# Altium schematic symbol library BARKO_SCHLIB.SchLib: 1064 symbols (part 9 of 11) (continued)
## R-5K6-0805 (continued)
RES SMD 5.6K OHM 1% 1/8W 0805; Manufacturer: Samsung; Manufacturer Part Number: RC2012F562CS; Resistance: 5.6kR; Power Rating: 125mW; Temperature Coefficient: 100ppm/°C; Voltage Rating (DC): 150V; .PCBCHK: USED; .Creator: F:TALI; Washability: OK; Stock 1: 13242; Pricing 1: 1=0.1, 10=0.059, 100=0.024, 1000=0.01079, 2500=0.00936 (USD); Case/Package: 0805; Case Code (Metric): 2012; Contact Plating: Tin; Min Operating Temperature: -55°C; Max Operating Temperature: 155°C; Tolerance: 1%; Packaging: Tape and Reel; Composition: Thick Film; Package Quantity: 1; Number of Terminations: 2; Max Power Dissipation: 125mW; Features: Moisture Resistant; Length: 0.079inch; Height: 0.024inch; Width: 0.049inch; Radiation Hardening: No; Lead Free: Lead Free; ComponentLink1URL: http://www1.futureelectronics.com/doc/SAMSUNG/RC2012F1004CS.pdf; ComponentLink1Description: http://www1.futureelectronics.com/doc/SAMSUNG/RC2012F1004CS.pdf; Stock 2: 21475; Pricing 2: 1=0.1, 10=0.069, 100=0.028, 1000=0.01256, 2500=0.0109 (USD); Mount: Surface Mount; Number of Pins: 2; Weight: 0.000194oz; Voltage Rating: 150V; Military Standard: Not; Termination: SMD/SMT; Depth: 1.25mm; REACH SVHC: Unknown; ComponentLink2URL: http://www.farnell.com/datasheets/2111203.pdf; ComponentLink2Description: http://www.farnell.com/datasheets/2111203.pdf; ComponentLink3URL: http://uk.rs-online.com/webdocs/0d98/0900766b80d98b26.pdf; ComponentLink3Description: http://uk.rs-online.com/webdocs/0d98/0900766b80d98b26.pdf; ComponentLink4URL: https://www.alliedelec.com/m/d/0c934d6939ccefa68dbe0b96d821c8cf.pdf; ComponentLink4Description: https://www.alliedelec.com/m/d/0c934d6939ccefa68dbe0b96d821c8cf.pdf; ComponentLink5URL: http://www.vishay.com/docs/20035/dcrcwe3.pdf; ComponentLink5Description: http://www.vishay.com/docs/20035/dcrcwe3.pdf; ComponentLink6URL: http://www.farnell.com/datasheets/2046716.pdf; ComponentLink6Description: http://www.farnell.com/datasheets/2046716.pdf; ComponentLink7URL: https://www.distrelec.biz/Web/Downloads/a_/en/flD-CRCW-e3_data_en.pdf?mime=application%2Fpdf; ComponentLink7Description: https://www.distrelec.biz/Web/Downloads/a_/en/flD-CRCW-e3_data_en.pdf?mime=application%2Fpdf; ComponentLink8URL: http://www.farnell.com/datasheets/1847332.pdf; ComponentLink8Description: http://www.farnell.com/datasheets/1847332.pdf; Stock 3: 198503; Pricing 3: 1=0.1, 10=0.081, 100=0.0311, 1000=0.01367, 2500=0.01181 (USD); ComponentLink9URL: http://industrial.panasonic.com/www-data/pdf/AOA0000/AOA0000CE2.pdf; ComponentLink9Description: http://industrial.panasonic.com/www-data/pdf/AOA0000/AOA0000CE2.pdf; ComponentLink10URL: http://www.farnell.com/datasheets/426256.pdf; ComponentLink10Description: http://www.farnell.com/datasheets/426256.pdf; ComponentLink11URL: http://www.farnell.com/datasheets/1678782.pdf; ComponentLink11Description: http://www.farnell.com/datasheets/1678782.pdf; ComponentLink12URL: https://www.alliedelec.com/m/d/623f45ff1957d936ff56d46fd1c28cac.pdf; ComponentLink12Description: https://www.alliedelec.com/m/d/623f45ff1957d936ff56d46fd1c28cac.pdf; ComponentLink13URL: http://www.mouser.com/ds/2/315/AOA0000C283-1093288.pdf; ComponentLink13Description: http://www.mouser.com/ds/2/315/AOA0000C283-1093288.pdf; .SCHCHK: USED; Supplier 1: Digi-Key; Supplier Part Number 1: 1276-5314-1-ND
footprint R-0805
pins: 1, 2

## R-5mR-1206
designator R?, comment 5mR  Power Rating: 3/4W  Case/Package: 1206
RES 0.005 OHM 2% 3/4W 1206; Manufacturer: Susumu; Manufacturer Part Number: KRL1632E-M-R005-G-T5; Temperature Coefficient: 100ppm/°C; Max Power Dissipation: 750mW; Washability: OK; .Creator: M.OZKAN; .PCBCHK: USED; Supplier 1: Digi-Key; Stock 1: 6696; Pricing 1: 1 = 0.54000, 10 = 0.38500, 25 = 0.30040, 50 = 0.25420, 100 = 0.20020, 250 = 0.16940, 500 = 0.13860, 1000 = 0.10780 (USD); RoHS: Yes; Case Code (Metric): 1632; Case Code (Imperial): 0612; Min Operating Temperature: -55°C; Max Operating Temperature: 155°C; Resistance: 5mR; Tolerance: 2%; Packaging: Tape and Reel; Package Quantity: 5000; Termination: SMD/SMT; Composition: Metal Foil; Number of Terminations: 2; Features: Automotive AEC-Q200; Length: 0.126inch; Height: 0.028inch; Width: 1.6mm; ComponentLink1URL: https://datasheet.ciiva.com/14981/krl-new-short-data-sheet-14981981.pdf?src-supplier=Digi-Key; ComponentLink1Description: https://datasheet.ciiva.com/14981/krl-new-short-data-sheet-14981981.pdf?src-supplier=Digi-Key; ComponentLink2URL: https://datasheet.ciiva.com/14981/krl-new-short-data-sheet-14981982.pdf?src-supplier=Digi-Key; ComponentLink2Description: https://datasheet.ciiva.com/14981/krl-new-short-data-sheet-14981982.pdf?src-supplier=Digi-Key; Supplier Part Number 1: 408-1565-1-ND; .SCHCHK: USED
footprint R-1206
pins: 1, 2

## R-6k2-1206-0.1%
designator R?, comment 6K2  Tolerance: 0.1%  Case/Package: 1206
RES SMD 6.2K OHM 0.1% 1/4W 1206; Manufacturer: Panasonic; Manufacturer Part Number: ERA-8AEB622V; Resistance: 6.2kR; Temperature Coefficient: 25ppm/°C; Power Rating: 250mW; Voltage Rating: 150V; Supplier 1: Digi-Key; Supplier Part Number 1: P6.2KBCCT-ND; Stock: 6467; Pricing: 1=0.57, 10=0.411, 100=0.2135, 1000=0.1149, 2500=0.1117 (USD); RoHS: Yes; Mount: Surface Mount; Number of Pins: 2; Contact Plating: Tin; Case Code (Metric): 3216; Case Code (Imperial): 1206; Min Operating Temperature: -55°C; Max Operating Temperature: 155°C; Resistor Type: Thin Film,Metal Film; Packaging: Tape and Reel; Package Quantity: 5000; Number of Terminations: 2; Termination: SMD/SMT; Max Power Dissipation: 250mW; Voltage Rating (DC): 150V; Length: 3.2mm; Width: 0.063inch; Height: 0.6mm; Depth: 1.6mm; Radiation Hardening: No; REACH SVHC: No SVHC; Military Standard: Not; Lead Free: Lead Free; ComponentLink1URL: https://datasheet.ciiva.com/48425/era-eng-tds-48425576.pdf?src-supplier=Distrelec; ComponentLink1Description: https://datasheet.ciiva.com/48425/era-eng-tds-48425576.pdf?src-supplier=Distrelec; ComponentLink2URL: https://datasheet.ciiva.com/17212/aoa0000ce26-17212732.pdf?src-supplier=Avnet+Europe; ComponentLink2Description: https://datasheet.ciiva.com/17212/aoa0000ce26-17212732.pdf?src-supplier=Avnet+Europe; ComponentLink3URL: https://datasheet.ciiva.com/48529/era-eng-tds-48529628.pdf?src-supplier=Distrelec; ComponentLink3Description: https://datasheet.ciiva.com/48529/era-eng-tds-48529628.pdf?src-supplier=Distrelec; ComponentLink4URL: https://datasheet.ciiva.com/5875/391390-5875614.pdf?src-supplier=Farnell; ComponentLink4Description: https://datasheet.ciiva.com/5875/391390-5875614.pdf?src-supplier=Farnell
footprint R-1206
pins: 1, 2

## R-6K04-0402
designator R?, comment 6K04  Case Code (Imperial): 0402
RES SMD 6.04K OHM 1% 1/10W 0402; Manufacturer: Panasonic; Manufacturer Part Number: ERJ-2RKF6041X; Resistance: 6.04kR; Power Rating: 100mW; Voltage Rating: 50V; Temperature Coefficient: 100ppm/°C; .PCBCHK: USED; .Creator: F:TALI; Washability: OK; Stock 1: 815195; Pricing 1: 1=0.1, 10=0.045, 100=0.0183, 1000=0.00823, 2500=0.00715, 5000=0.0059 (USD); Mount: Surface Mount; Case/Package: 0402; Case Code (Metric): 1005; Contact Plating: Tin; Min Operating Temperature: -55°C; Max Operating Temperature: 155°C; Tolerance: 1%; Packaging: Tape and Reel; Package Quantity: 1; Composition: Thick Film; Number of Terminations: 2; Termination: SMD/SMT; Military Standard: Not; Max Power Dissipation: 100mW; Voltage Rating (DC): 50V; Features: Automotive AEC-Q200; Length: 1mm; Height: 0.35mm; Width: 0.02inch; Depth: 0.5mm; REACH SVHC: Unknown; Lead Free: Lead Free; ComponentLink1URL: http://www.farnell.com/datasheets/1911175.pdf; ComponentLink1Description: http://www.farnell.com/datasheets/1911175.pdf; ComponentLink2URL: http://www.farnell.com/datasheets/1678782.pdf; ComponentLink2Description: http://www.farnell.com/datasheets/1678782.pdf; ComponentLink3URL: http://www.jameco.com/Jameco/Products/ProdDS/1987409.pdf; ComponentLink3Description: http://www.jameco.com/Jameco/Products/ProdDS/1987409.pdf; ComponentLink4URL: http://www.mouser.com/ds/2/315/AOA0000CE2-37512.pdf; ComponentLink4Description: http://www.mouser.com/ds/2/315/AOA0000CE2-37512.pdf; ComponentLink5URL: http://industrial.panasonic.com/www-data/pdf/AOA0000/AOA0000CE2.pdf; ComponentLink5Description: http://industrial.panasonic.com/www-data/pdf/AOA0000/AOA0000CE2.pdf; ComponentLink6URL: https://www.alliedelec.com/m/d/623f45ff1957d936ff56d46fd1c28cac.pdf; ComponentLink6Description: https://www.alliedelec.com/m/d/623f45ff1957d936ff56d46fd1c28cac.pdf; ComponentLink7URL: http://www.farnell.com/datasheets/426256.pdf; ComponentLink7Description: http://www.farnell.com/datasheets/426256.pdf; Stock 2: 46790; Pricing 2: 1=0.1, 10=0.016, 100=0.0064, 1000=0.00289, 2500=0.0025, 5000=0.00207 (USD); Radiation Hardening: No; Stock 3: 150070; Pricing 3: 1=0.1, 10=0.021, 100=0.0087, 1000=0.00391, 2500=0.00339, 5000=0.0028 (USD); ComponentLink8URL: http://www.samsungsem.com/kr/support/product-search/chip-resistor/RC1005F6041CS.jsp; ComponentLink8Description: http://www.samsungsem.com/kr/support/product-search/chip-resistor/RC1005F6041CS.jsp; ComponentLink9URL: http://www.samsungsem.com/kr/support/library/product-catalog/__icsFiles/afieldfile/2015/09/22/CHIP_RESISTOR_2015.pdf; ComponentLink9Description: http://www.samsungsem.com/kr/support/library/product-catalog/__icsFiles/afieldfile/2015/09/22/CHIP_RESISTOR_2015.pdf; ComponentLink10URL: https://produktinfo.conrad.com/datenblaetter/625000-649999/631535-da-01-en-SMD_WID_RC_1005_6K04_1__0_063W_10000ST.pdf; ComponentLink10Description: https://produktinfo.conrad.com/datenblaetter/625000-649999/631535-da-01-en-SMD_WID_RC_1005_6K04_1__0_063W_10000ST.pdf; .SCHCHK: USED; Supplier 1: Digi-Key; Supplier Part Number 1: RMCF0402FT6K04CT-ND
footprint R-0402
pins: 1, 2

## R-6K04-0603
designator R?, comment 6K04  Case/Package: 0603
RES 6.04K OHM 1% 1/10W 0603; Manufacturer: Stackpole Electronics; Manufacturer Part Number: RMCF0603FT6K04; Resistance: 6.04kR; Power Rating: 100mW; Temperature Coefficient: 100ppm/°C; Washability: OK; .Creator: M.OZKAN; .PCBCHK: USED; Supplier 1: Digi-Key; Stock 1: 117757; Pricing 1: 1=0.10000, 10=0.01700, 100=0.00680, 1000=0.00306, 2500=0.00266 (USD); RoHS: Yes; Mount: Surface Mount; Case Code (Metric): 1608; Case Code (Imperial): 0603; Contact Plating: Tin; Min Operating Temperature: -55°C; Max Operating Temperature: 155°C; Packaging: Tape and Reel; Tolerance: 1%; Composition: Thick Film; Number of Terminations: 2; Max Power Dissipation: 100mW; Features: Automotive AEC-Q200; Length: 0.061inch; Height: 0.022inch; Width: 0.031inch; Radiation Hardening: No; Lead Free: Lead Free; ComponentLink1URL: https://www.seielect.com/catalog/SEI-RMCF_RMCP.pdf?src-supplier=Avnet; ComponentLink1Description: https://www.seielect.com/catalog/SEI-RMCF_RMCP.pdf?src-supplier=Avnet; ComponentLink2URL: https://www.seielect.com/catalog/SEI-Packaging.pdf?src-supplier=Digi-Key; ComponentLink2Description: https://www.seielect.com/catalog/SEI-Packaging.pdf?src-supplier=Digi-Key; ComponentLink3URL: http://www.seielect.com/Catalog/SEI-RMC.pdf?src-supplier=Future+Electronics; ComponentLink3Description: http://www.seielect.com/Catalog/SEI-RMC.pdf?src-supplier=Future+Electronics; ComponentLink4URL: http://components.arrow.com/part/dataview/44987894S7815445N1174?src-supplier=Arrow; ComponentLink4Description: http://components.arrow.com/part/dataview/44987894S7815445N1174?src-supplier=Arrow; ComponentLink5URL: https://www.seielect.com/catalog/SEI-RMCF_RMCP.pdf?src-supplier=Avnet+Asia; ComponentLink5Description: https://www.seielect.com/catalog/SEI-RMCF_RMCP.pdf?src-supplier=Avnet+Asia; Supplier Part Number 1: RMCF0603FT6K04CT-ND; .SCHCHK: USED
footprint R-0603
pins: 1, 2

## R-6K8-0603
designator R?, comment 6K8  Case Code (Imperial): 0603
RES SMD 6.8K OHM 5% 1/10W 0603; Manufacturer: Yageo; Manufacturer Part Number: RC0603JR-076K8L; Resistance: 6.8kR; Power Rating: 100mW; Voltage Rating: 50V; Temperature Coefficient: 100ppm/°C; Working Voltage: 75V; .PCBCHK: USED; .Creator: F:TALI; Washability: OK; Supplier 1: Digi-Key; Supplier Part Number 1: 311-6.8KGRDKR-ND; Stock 1: 0; Pricing 1: 1=0.1, 10=0.022, 100=0.0088, 1000=0.00396, 2500=0.00344 (USD); Case/Package: 0603; Number of Pins: 2; Case Code (Metric): 1608; Min Operating Temperature: -55°C; Max Operating Temperature: 155°C; Tolerance: 5%; Voltage Rating (DC): 50V; Packaging: Tape and Reel; Termination: SMD/SMT; Composition: Thick Film; Military Standard: Not; Number of Terminations: 2; Length: 1.6mm; Height: 0.45mm; Width: 0.8mm; Depth: 0.8mm; REACH SVHC: No SVHC; Lead Free: Lead Free; ComponentLink1URL: http://www.farnell.com/datasheets/1868787.pdf; ComponentLink1Description: http://www.farnell.com/datasheets/1868787.pdf; ComponentLink2URL: http://www.farnell.com/datasheets/443971.pdf; ComponentLink2Description: http://www.farnell.com/datasheets/443971.pdf; ComponentLink3URL: http://www.mouser.com/catalog/specsheets/RC0603.pdf; ComponentLink3Description: http://www.mouser.com/catalog/specsheets/RC0603.pdf; Supplier 2: Digi-Key; Supplier Part Number 2: SR0603JR-076K8L-ND; Stock 2: 0; Pricing 2: 5000=0.02189 (USD); Max Power Dissipation: 100mW; Features: Automotive AEC-Q200; Mount: Surface Mount; Weight: 7.1E-05oz; Contact Plating: Tin; Package Quantity: 1; Radiation Hardening: No; ComponentLink4URL: http://www.vishay.com/docs/20035/dcrcwe3.pdf; ComponentLink4Description: http://www.vishay.com/docs/20035/dcrcwe3.pdf; ComponentLink5URL: http://www.mouser.com/ds/2/427/dcrcwe3-109170.pdf; ComponentLink5Description: http://www.mouser.com/ds/2/427/dcrcwe3-109170.pdf; ComponentLink6URL: https://www.alliedelec.com/m/d/0c934d6939ccefa68dbe0b96d821c8cf.pdf; ComponentLink6Description: https://www.alliedelec.com/m/d/0c934d6939ccefa68dbe0b96d821c8cf.pdf; ComponentLink7URL: http://www.farnell.com/datasheets/1807946.pdf; ComponentLink7Description: http://www.farnell.com/datasheets/1807946.pdf; Supplier 3: Digi-Key; Supplier Part Number 3: P6.80KHCT-ND; Stock 3: 521469; Pricing 3: 1=0.1, 10=0.065, 100=0.0264, 1000=0.01186, 2500=0.01029 (USD); ComponentLink8URL: http://industrial.panasonic.com/www-data/pdf/AOA0000/AOA0000CE2.pdf; ComponentLink8Description: http://industrial.panasonic.com/www-data/pdf/AOA0000/AOA0000CE2.pdf; ComponentLink9URL: http://www.farnell.com/datasheets/1678782.pdf; ComponentLink9Description: http://www.farnell.com/datasheets/1678782.pdf; ComponentLink10URL: https://www.alliedelec.com/m/d/623f45ff1957d936ff56d46fd1c28cac.pdf; ComponentLink10Description: https://www.alliedelec.com/m/d/623f45ff1957d936ff56d46fd1c28cac.pdf; ComponentLink11URL: http://www.mouser.com/ds/2/315/AOA0000C283-1093288.pdf; ComponentLink11Description: http://www.mouser.com/ds/2/315/AOA0000C283-1093288.pdf; ComponentLink12URL: http://www.farnell.com/datasheets/426256.pdf; ComponentLink12Description: http://www.farnell.com/datasheets/426256.pdf; .SCHCHK: USED
footprint R-0603
pins: 1, 2

## R-6K8-0805
designator R?, comment 6K8  Case Code (Imperial): 0805
RES SMD 6.8K OHM 1% 1/8W 0805; Manufacturer: Yageo; Manufacturer Part Number: RC0805FR-076K8L; Resistance: 6.8kR; Power Rating: 125mW; Temperature Coefficient: 100ppm/°C; Voltage Rating: 150V; .PCBCHK: USED; .Creator: F:TALI; Washability: OK; Supplier 1: Digi-Key; Supplier Part Number 1: 311-6.80KCRCT-ND; Stock 1: 4564009; Pricing 1: 1=0.1, 10=0.046, 100=0.0186, 1000=0.00835, 2500=0.00725 (USD); Case/Package: 0805; Case Code (Metric): 2012; Min Operating Temperature: -55°C; Max Operating Temperature: 155°C; Tolerance: 1%; Packaging: Tape and Reel; Number of Terminations: 2; Package Quantity: 1; Termination: SMD/SMT; Composition: Thick Film; Max Power Dissipation: 125mW; Features: Moisture Resistant; Length: 0.079inch; Height: 0.024inch; Width: 0.049inch; Depth: 1.25mm; REACH SVHC: Unknown; Lead Free: Lead Free; ComponentLink1URL: http://www.yageo.com/documents/recent/PYu-RC_Group_51_RoHS_L_9.pdf; ComponentLink1Description: http://www.yageo.com/documents/recent/PYu-RC_Group_51_RoHS_L_9.pdf; ComponentLink2URL: http://documents.rs-components.com/techlib://itc_doclist_GB.htm?stockno=6181925; ComponentLink2Description: http://documents.rs-components.com/techlib://itc_doclist_GB.htm?stockno=6181925; ComponentLink3URL: http://www.yageo.com.tw/exep/pages/download/literatures/PYu-R_INT-thick_7.pdf; ComponentLink3Description: http://www.yageo.com.tw/exep/pages/download/literatures/PYu-R_INT-thick_7.pdf; ComponentLink4URL: http://www.farnell.com/datasheets/444164.pdf; ComponentLink4Description: http://www.farnell.com/datasheets/444164.pdf; Supplier 2: Digi-Key; Supplier Part Number 2: 311-6.8KARDKR-ND; Stock 2: 914; Pricing 2: 1=0.1, 10=0.039, 100=0.0159, 1000=0.00716, 2500=0.00622 (USD); Contact Plating: Lead,Matte,Tin; Military Standard: Not; Radiation Hardening: No; ComponentLink5URL: http://www.yageo.ru/pdf/RC0805.pdf; ComponentLink5Description: http://www.yageo.ru/pdf/RC0805.pdf; ComponentLink6URL: http://www.farnell.com/datasheets/442941.pdf; ComponentLink6Description: http://www.farnell.com/datasheets/442941.pdf; ComponentLink7URL: http://www.mouser.com/ds/2/447/Yageo_08112016_RC0805-968729.pdf; ComponentLink7Description: http://www.mouser.com/ds/2/447/Yageo_08112016_RC0805-968729.pdf; Supplier 3: Digi-Key; Supplier Part Number 3: YAG3748DKR-ND; Stock 3: 104504; Pricing 3: 1=0.1, 10=0.055, 100=0.0225, 1000=0.01009, 2500=0.00876 (USD); .SCHCHK: USED
footprint R-0805
pins: 1, 2

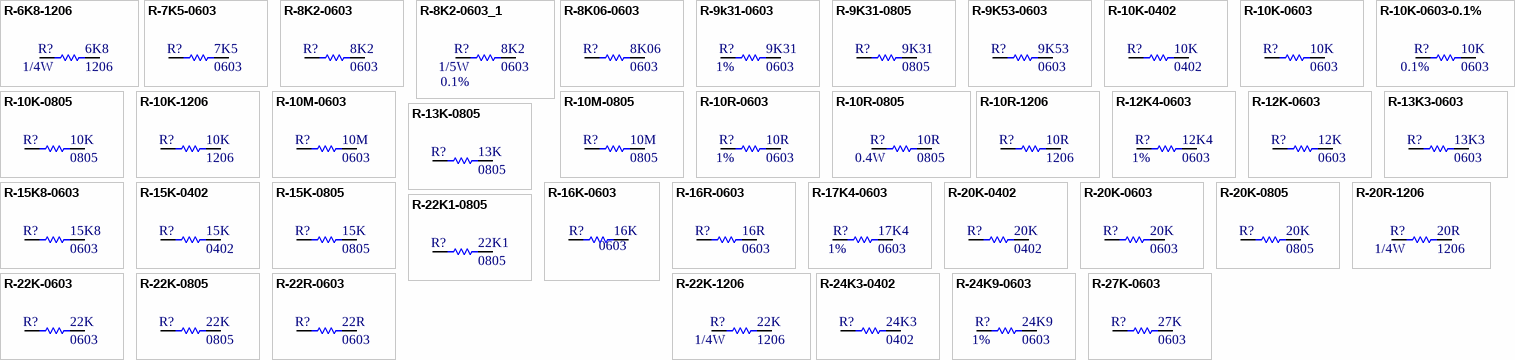
[diagram p37: symbols R-6K8-1206 to R-27K-0603]

## R-6K8-1206
designator R?, comment 6K8  Max Power Dissipation: 1/4W  Case Code (Imperial): 1206
RES SMD 6.8K 1/4W 5% 1206; Manufacturer: Panasonic; Manufacturer Part Number: ERJ-8ENF6801V; Resistance: 6.8kR; Tolerance: 1%; Temperature Coefficient: 100ppm/°C; Voltage Rating (DC): 200V; Power Rating: 250mW; .PCBCHK: USED; .Creator: F:TALI; Washability: OK; Stock 1: 0; Pricing 1: 1=0.11, 10=0.1, 100=0.0385, 1000=0.01695, 2500=0.01464 (USD); Mount: Surface Mount; Case/Package: 1206; Number of Pins: 2; Weight: 0.000571oz; Case Code (Metric): 3216; Contact Plating: Tin; Min Operating Temperature: -55°C; Max Operating Temperature: 155°C; Packaging: Tape and Reel; Composition: Thick Film; Number of Terminations: 2; Package Quantity: 1; Features: Automotive AEC-Q200; Military Standard: Not; Voltage Rating: 200V; Termination: SMD/SMT; Length: 3.2mm; Height: 0.6mm; Width: 1.6mm; Depth: 1.6mm; Radiation Hardening: No; REACH SVHC: No SVHC; ComponentLink1URL: http://www.farnell.com/datasheets/1678782.pdf; ComponentLink1Description: http://www.farnell.com/datasheets/1678782.pdf; ComponentLink2URL: http://industrial.panasonic.com/cdbs/www-data/pdf/RDA0000/AOA0000COL19.pdf; ComponentLink2Description: http://industrial.panasonic.com/cdbs/www-data/pdf/RDA0000/AOA0000COL19.pdf; ComponentLink3URL: http://www.farnell.com/datasheets/426256.pdf; ComponentLink3Description: http://www.farnell.com/datasheets/426256.pdf; ComponentLink4URL: https://www.alliedelec.com/m/d/623f45ff1957d936ff56d46fd1c28cac.pdf; ComponentLink4Description: https://www.alliedelec.com/m/d/623f45ff1957d936ff56d46fd1c28cac.pdf; ComponentLink5URL: http://industrial.panasonic.com/www-data/pdf/AOA0000/AOA0000CE2.pdf; ComponentLink5Description: http://industrial.panasonic.com/www-data/pdf/AOA0000/AOA0000CE2.pdf; Stock 2: 225848; Pricing 2: 1=0.1, 10=0.081, 100=0.0331, 1000=0.01487, 2500=0.01291 (USD); Lead Free: Lead Free; ComponentLink6URL: http://documents.rs-components.com/techlib://itc_doclist_GB.htm?stockno=6178626; ComponentLink6Description: http://documents.rs-components.com/techlib://itc_doclist_GB.htm?stockno=6178626; ComponentLink7URL: http://www.yageo.com/documents/recent/PYu-RC1206_51_RoHS_L-4.pdf; ComponentLink7Description: http://www.yageo.com/documents/recent/PYu-RC1206_51_RoHS_L-4.pdf; Stock 3: 13302; Pricing 3: 1=0.1, 10=0.03, 100=0.0121, 1000=0.00545, 2500=0.00473 (USD); .SCHCHK: USED; Supplier 1: Digi-Key; Supplier Part Number 1: RMCF1206JT6K80DKR-ND
footprint R-1206
pins: 1, 2

## R-7K5-0603
designator R?, comment 7K5  Case Code (Imperial): 0603
RES 7.5K OHM 1% 1/10W 0603; Manufacturer: Stackpole Electronics; Manufacturer Part Number: RMCF0603FT7K50; Washability: OK; .Creator: M.OZKAN; .PCBCHK: USED; Max Power Dissipation: 100mW; Temperature Coefficient: 100ppm/°C; Resistance: 7.5kR; ComponentLink1URL: https://datasheet.ciiva.com/26946/getdatasheetpartid-717664-26946710.pdf?src-supplier=Verical; ComponentLink1Description: https://datasheet.ciiva.com/26946/getdatasheetpartid-717664-26946710.pdf?src-supplier=Verical; .SCHCHK: USED; Supplier 1: Digi-Key; Supplier Part Number 1: RMCF0603FT7K50CT-ND; Stock: 158123; Pricing: 1=0.1, 10=0.015, 100=0.0059, 1000=0.0027, 2500=0.0023 (USD); RoHS: Yes; Mount: Surface Mount; Case/Package: 0603; Contact Plating: Tin,Matte; Case Code (Metric): 1608; Min Operating Temperature: -55°C; Max Operating Temperature: 155°C; Features: Automotive AEC-Q200; Power Rating: 100mW; Tolerance: 1%; Packaging: Tape and Reel; Resistor Type: Thick Film; Number of Terminations: 2; Length: 0.061inch; Height: 0.022inch; Width: 0.031inch; Depth: 0.8mm; Radiation Hardening: No; Military Standard: Not; Lead Free: Lead Free
footprint R-0603
pins: 1, 2

## R-8K2-0603
designator R?, comment 8K2  Case Code (Imperial): 0603
RES SMD 8.2K OHM 5% 1/10W 0603; Manufacturer: Stackpole Electronics; Manufacturer Part Number: RMCF0603FT8K20; .PCBCHK: USED; .Creator: F:TALI; Washability: OK; Resistance: 8.2kR; Power Rating: 100mW; Tolerance: 1%; Temperature Coefficient: 100ppm/°C; ComponentLink1URL: http://www.samsungsem.com/kr/support/product-search/chip-resistor/RC1608J822CS.jsp; ComponentLink1Description: http://www.samsungsem.com/kr/support/product-search/chip-resistor/RC1608J822CS.jsp; ComponentLink2URL: http://www.farnell.com/datasheets/1678782.pdf; ComponentLink2Description: http://www.farnell.com/datasheets/1678782.pdf; ComponentLink3URL: http://www.mouser.com/ds/2/315/AOA0000C283-1093288.pdf; ComponentLink3Description: http://www.mouser.com/ds/2/315/AOA0000C283-1093288.pdf; ComponentLink4URL: https://www.alliedelec.com/m/d/623f45ff1957d936ff56d46fd1c28cac.pdf; ComponentLink4Description: https://www.alliedelec.com/m/d/623f45ff1957d936ff56d46fd1c28cac.pdf; ComponentLink5URL: http://industrial.panasonic.com/www-data/pdf/AOA0000/AOA0000CE2.pdf; ComponentLink5Description: http://industrial.panasonic.com/www-data/pdf/AOA0000/AOA0000CE2.pdf; ComponentLink6URL: http://www.yageo.com/documents/recent/PYu-RT_1-to-0.05_RoHS_L_6.pdf; ComponentLink6Description: http://www.yageo.com/documents/recent/PYu-RT_1-to-0.05_RoHS_L_6.pdf; ComponentLink7URL: http://www.yageo.com/NewPortal/yageodocoutput?fileName=/pdf/R-Chip/PYu-RT_1-to-0.05_RoHS_L_5.pdf; ComponentLink7Description: http://www.yageo.com/NewPortal/yageodocoutput?fileName=/pdf/R-Chip/PYu-RT_1-to-0.05_RoHS_L_5.pdf; .SCHCHK: USED; Supplier 1: Digi-Key; Supplier Part Number 1: RMCF0603FT8K20CT-ND; Stock: 109879; Pricing: 1=0.1, 10=0.015, 100=0.0059, 1000=0.0027, 2500=0.0023 (USD); RoHS: Yes; Mount: Surface Mount; Case/Package: 0603; Case Code (Metric): 1608; Contact Plating: Tin,Matte; Min Operating Temperature: -55°C; Max Operating Temperature: 155°C; Packaging: Tape and Reel; Features: Automotive AEC-Q200; Resistor Type: Thick Film; Number of Terminations: 2; Max Power Dissipation: 100mW; Length: 1.55mm; Height: 0.022inch; Width: 0.031inch; Depth: 0.8mm; Radiation Hardening: No; Military Standard: Not; Lead Free: Lead Free; ComponentLink8URL: http://components.arrow.com/part/dataview/50865266S797644N1174?src-supplier=Arrow+Electronics; ComponentLink8Description: http://components.arrow.com/part/dataview/50865266S797644N1174?src-supplier=Arrow+Electronics; ComponentLink9URL: https://www.seielect.com/catalog/SEI-RMCF_RMCP.pdf?src-supplier=Avnet; ComponentLink9Description: https://www.seielect.com/catalog/SEI-RMCF_RMCP.pdf?src-supplier=Avnet; ComponentLink10URL: https://www.seielect.com/catalog/SEI-Packaging.pdf?src-supplier=Digi-Key; ComponentLink10Description: https://www.seielect.com/catalog/SEI-Packaging.pdf?src-supplier=Digi-Key; ComponentLink11URL: https://www.seielect.com/catalog/SEI-RMCF_RMCP.pdf?src-supplier=Avnet+Asia; ComponentLink11Description: https://www.seielect.com/catalog/SEI-RMCF_RMCP.pdf?src-supplier=Avnet+Asia
footprint R-0603
pins: 1, 2

## R-8K2-0603_1
designator R?, comment 8K2  Max Power Dissipation: 1/5W  Tolerance: 0.1%  Case Code (Imperial): 0603
RES SMD 8.2K OHM 0.1% 1/5W 0603; Manufacturer: Panasonic; Manufacturer Part Number: ERJ-PB3B8201V; Resistance: 8.2kR; Temperature Coefficient: 50ppm/°C; .PCBCHK: USED; .Creator: F:TALI; Washability: OK; Supplier 1: Digi-Key; Supplier Part Number 1: P20076DKR-ND; Stock 1: 942; Pricing 1: 1=0.25, 10=0.211, 25=0.1532, 50=0.111, 100=0.0823, 250=0.06316, 500=0.04976, 1000=0.03445 (USD); Case/Package: 0603; Case Code (Metric): 1608; Min Operating Temperature: -55°C; Max Operating Temperature: 155°C; Packaging: Tape and Reel; Composition: Thick Film; Number of Terminations: 2; Features: Automotive AEC-Q200; Length: 0.063inch; Width: 0.032inch; Height - Seated (Max): 0.022inch; .SCHCHK: USED
footprint R-0603
pins: 1, 2

## R-8K06-0603
designator R?, comment 8K06  Case Code (Imperial): 0603
RES SMD 8.06K OHM 1% 1/10W 0603; Manufacturer: Stackpole Electronics; Manufacturer Part Number: RMCF0603FT8K06; Resistance: 8.06kR; Power Rating: 100mW; Temperature Coefficient: 100ppm/°C; Washability: OK; .Creator: M.OZKAN; .PCBCHK: USED; Supplier 1: Arrow; Stock 1: 300; Pricing 1: 1=0,09500, 10=0,01600, 25=0,01590, 100=0,00640, 250=0,00630 (USD); RoHS: Yes; Mount: Surface Mount; Case/Package: 0603; Case Code (Metric): 1608; Contact Plating: Tin,Matte; Min Operating Temperature: -55°C; Max Operating Temperature: 155°C; Tolerance: 1%; Packaging: Tape and Reel; Composition: Thick Film; Number of Terminations: 2; Military Standard: Not; Max Power Dissipation: 100mW; Features: Automotive AEC-Q200; Length: 1.55mm; Height: 0.022inch; Width: 0.031inch; Depth: 0.8mm; Radiation Hardening: No; Lead Free: Lead Free; ComponentLink1URL: http://components.arrow.com/part/dataview/50576846S182869N1174?src-supplier=Arrow; ComponentLink1Description: http://components.arrow.com/part/dataview/50576846S182869N1174?src-supplier=Arrow; ComponentLink2URL: https://www.seielect.com/Catalog/SEI-RMCF_RMCP.pdf?src-supplier=Digi-Key; ComponentLink2Description: https://www.seielect.com/Catalog/SEI-RMCF_RMCP.pdf?src-supplier=Digi-Key; ComponentLink3URL: https://www.seielect.com/catalog/SEI-RMCF_RMCP.pdf?src-supplier=Avnet; ComponentLink3Description: https://www.seielect.com/catalog/SEI-RMCF_RMCP.pdf?src-supplier=Avnet; ComponentLink4URL: https://www.seielect.com/catalog/SEI-Packaging.pdf?src-supplier=Digi-Key; ComponentLink4Description: https://www.seielect.com/catalog/SEI-Packaging.pdf?src-supplier=Digi-Key; ComponentLink5URL: https://www.seielect.com/catalog/SEI-RMCF_RMCP.pdf?src-supplier=Avnet+Asia; ComponentLink5Description: https://www.seielect.com/catalog/SEI-RMCF_RMCP.pdf?src-supplier=Avnet+Asia; Supplier Part Number 1: RMCF0603FT8K06; .SCHCHK: USED
footprint R-0603
pins: 1, 2

## R-9k31-0603
designator R?, comment 9K31  Case/Package: 0603  Tolerance: 1%
RES 9.31K OHM 1% 1/10W 0603; Manufacturer: Stackpole Electronics; Manufacturer Part Number: RMCF0603FT9K31; Resistance: 9.31kR; Temperature Coefficient: 100ppm/°C; Power Rating: 100mW; Supplier 1: Digi-Key; Supplier Part Number 1: RMCF0603FT9K31CT-ND; Stock: 4886; Pricing: 1=0.1, 10=0.015, 100=0.0059, 1000=0.0027, 2500=0.0023 (USD); RoHS: Yes; Mount: Surface Mount; Contact Plating: Tin,Matte; Case Code (Imperial): 0603; Case Code (Metric): 1608; Min Operating Temperature: -55°C; Max Operating Temperature: 155°C; Packaging: Tape and Reel; Resistor Type: Thick Film; Max Power Dissipation: 100mW; Features: Automotive AEC-Q200; Number of Terminations: 2; Length: 0.061inch; Height: 0.022inch; Width: 0.031inch; Radiation Hardening: No; Lead Free: Lead Free; ComponentLink1URL: http://components.arrow.com/part/dataview/40960841S7381480N1174?src-supplier=Arrow+Electronics; ComponentLink1Description: http://components.arrow.com/part/dataview/40960841S7381480N1174?src-supplier=Arrow+Electronics; ComponentLink2URL: https://www.seielect.com/Catalog/SEI-RMCF_RMCP.pdf?src-supplier=Digi-Key; ComponentLink2Description: https://www.seielect.com/Catalog/SEI-RMCF_RMCP.pdf?src-supplier=Digi-Key; ComponentLink3URL: https://www.seielect.com/catalog/SEI-Packaging.pdf?src-supplier=Digi-Key; ComponentLink3Description: https://www.seielect.com/catalog/SEI-Packaging.pdf?src-supplier=Digi-Key; ComponentLink4URL: http://www.seielect.com/Catalog/SEI-RMC.pdf?src-supplier=Future+Electronics; ComponentLink4Description: http://www.seielect.com/Catalog/SEI-RMC.pdf?src-supplier=Future+Electronics; ComponentLink5URL: https://www.seielect.com/catalog/SEI-RMCF_RMCP.pdf?src-supplier=Avnet; ComponentLink5Description: https://www.seielect.com/catalog/SEI-RMCF_RMCP.pdf?src-supplier=Avnet
footprint R-0603
pins: 1, 2

## R-9K31-0805
designator R?, comment 9K31  Case/Package: 0805
RES 9.31K OHM 1/8W 1% 0805; Manufacturer 1: Stackpole Electronics; Manufacturer Part Number: RMCF0805FT9K31; Max Power Dissipation: 125mW; Temperature Coefficient: 100ppm/°C; Resistance: 9.31kR; .Creator: M.OZKAN; .PCBCHK: USED; Supplier 1: Digi-Key; Supplier Part Number 1: 738-RMCF0805FT9K31CT-ND; RoHS: Yes; Category: Chip SMD Resistors; Stock: 5270; Pricing: 1=0,10000, 10=0,02600, 100=0,01040, 1000=0,00466, 2500=0,00405 (USD); Mount: Surface Mount; Case Code (Imperial): 0805; Case Code (Metric): 2012; Contact Plating: Tin,Matte; Min Operating Temperature: -55°C; Max Operating Temperature: 155°C; Composition: Thick Film; Features: Automotive AEC-Q200; Number of Terminations: 2; Package Quantity: 5000; Packaging: Tape and Reel; Tolerance: 1%; Length: 0.079inch; Height: 0.026inch; Width: 0.049inch; Radiation Hardening: No; ComponentLink1URL: https://www.seielect.com/Catalog/SEI-RMCF_RMCP.pdf?src-supplier=Digi-Key; ComponentLink1Description: https://www.seielect.com/Catalog/SEI-RMCF_RMCP.pdf?src-supplier=Digi-Key; ComponentLink2URL: https://www.seielect.com/catalog/SEI-RMCF_RMCP.pdf?src-supplier=Avnet; ComponentLink2Description: https://www.seielect.com/catalog/SEI-RMCF_RMCP.pdf?src-supplier=Avnet; ComponentLink3URL: https://www.seielect.com/catalog/SEI-Packaging.pdf?src-supplier=Digi-Key; ComponentLink3Description: https://www.seielect.com/catalog/SEI-Packaging.pdf?src-supplier=Digi-Key; ComponentLink4URL: http://www.seielect.com/Catalog/SEI-RMCF_RMCP.pdf?src-supplier=Digi-Key; ComponentLink4Description: http://www.seielect.com/Catalog/SEI-RMCF_RMCP.pdf?src-supplier=Digi-Key; .SCHCHK: USED
footprint R-0805
pins: 1, 2

## R-9K53-0603
designator R?, comment 9K53  Case Code (Imperial): 0603
RES SMD 9.53K OHM 1% 1/10W 0603; Manufacturer: Yageo; Manufacturer Part Number: RC0603FR-079K53L; Resistance: 9.53kR; Power Rating: 100mW; Voltage Rating: 75V; Temperature Coefficient: 100ppm/°C; Voltage Rating (DC): 50V; .PCBCHK: USED; .Creator: F:TALI; Washability: OK; Case/Package: 0603; Weight: 7.1E-05oz; Case Code (Metric): 1608; Min Operating Temperature: -55°C; Max Operating Temperature: 155°C; Package Quantity: 1; Tolerance: 1%; Packaging: Tape and Reel; Composition: Thick Film; Number of Terminations: 2; Termination: SMD/SMT; Military Standard: Not; Max Power Dissipation: 100mW; Features: Moisture Resistant; Length: 1.6mm; Height: 0.022inch; Width: 0.031inch; Depth: 0.8mm; Lead Free: Lead Free; ComponentLink1URL: http://www.yageo.com/documents/recent/PYu-RC_Group_51_RoHS_L_9.pdf; ComponentLink1Description: http://www.yageo.com/documents/recent/PYu-RC_Group_51_RoHS_L_9.pdf; ComponentLink2URL: http://www.yageo.com.tw/exep/pages/download/literatures/PYu-R_INT-thick_7.pdf; ComponentLink2Description: http://www.yageo.com.tw/exep/pages/download/literatures/PYu-R_INT-thick_7.pdf; Supplier 1: Digi-Key; Supplier Part Number 1: RMCF0603FT9K53CT-ND; Stock 1: 12871; Pricing 1: 1=0.1, 10=0.018, 100=0.0071, 1000=0.00321, 2500=0.00278 (USD); Mount: Surface Mount; Contact Plating: Matte,Tin; Radiation Hardening: No; Supplier 2: Digi-Key; Supplier Part Number 2: 311-9.53KHRCT-ND; Stock 2: 625051; Pricing 2: 1=0.1, 10=0.026, 100=0.0107, 1000=0.00478, 2500=0.00415 (USD); Supplier 3: Digi-Key; Supplier Part Number 3: P9.53KHCT-ND; Stock 3: 166479; Pricing 3: 1=0.1, 10=0.065, 100=0.0264, 1000=0.01186, 2500=0.01029 (USD); REACH SVHC: No SVHC; ComponentLink3URL: http://www.farnell.com/datasheets/1678782.pdf; ComponentLink3Description: http://www.farnell.com/datasheets/1678782.pdf; ComponentLink4URL: http://industrial.panasonic.com/www-data/pdf/AOA0000/AOA0000CE2.pdf; ComponentLink4Description: http://industrial.panasonic.com/www-data/pdf/AOA0000/AOA0000CE2.pdf; ComponentLink5URL: http://www.farnell.com/datasheets/426256.pdf; ComponentLink5Description: http://www.farnell.com/datasheets/426256.pdf; ComponentLink6URL: http://www.farnell.com/datasheets/1911175.pdf; ComponentLink6Description: http://www.farnell.com/datasheets/1911175.pdf; ComponentLink7URL: https://www.alliedelec.com/m/d/623f45ff1957d936ff56d46fd1c28cac.pdf; ComponentLink7Description: https://www.alliedelec.com/m/d/623f45ff1957d936ff56d46fd1c28cac.pdf; .SCHCHK: USED
footprint R-0603
pins: 1, 2

## R-10K-0402
designator R?, comment 10K  Case Code (Imperial): 0402
RES SMD 10K OHM 1% 1/10W 0402; Manufacturer: Vishay Beyschlag; Manufacturer Part Number: MCS04020C1002FE000; Resistance: 10kR; Temperature Coefficient: 50ppm/°C; Power Rating: 63mW; Voltage Rating: 50V; Max Power Dissipation: 100mW; .PCBCHK: USED; .Creator: F:TALI; Washability: OK; Supplier 1: Digi-Key; Supplier Part Number 1: MCS0402-10.0K-CFCT-ND; Stock 1: 177106; Pricing 1: 1=0.3, 10=0.254, 100=0.0993, 1000=0.04158, 2500=0.03812, 5000=0.03465 (USD); Mount: Surface Mount; Case/Package: 0402; Weight: 2.3E-05oz; Contact Plating: Tin; Case Code (Metric): 1005; Min Operating Temperature: -55°C; Max Operating Temperature: 125°C; Tolerance: 1%; Composition: Thin Film; Packaging: Tape and Reel; Package Quantity: 1; Number of Terminations: 2; Termination: SMD/SMT; Military Standard: Not; Voltage Rating (DC): 50V; Length: 1mm; Height: 0.015inch; Width: 0.02inch; Depth: 0.5mm; Radiation Hardening: No; REACH SVHC: No SVHC; Lead Free: Lead Free; ComponentLink1URL: http://www.vishay.com/docs/28705/mcx0x0xpro.pdf; ComponentLink1Description: http://www.vishay.com/docs/28705/mcx0x0xpro.pdf; ComponentLink2URL: http://www.vishay.com/docs/28705/mc_pro.pdf; ComponentLink2Description: http://www.vishay.com/docs/28705/mc_pro.pdf; Supplier 2: Digi-Key; Supplier Part Number 2: 541-10.0KYCT-ND; Stock 2: 129484; Pricing 2: 1=0.15, 10=0.138, 100=0.0532, 1000=0.02343, 2500=0.02023, 5000=0.0181 (USD); ComponentLink3URL: http://www.vishay.com/docs/20043/crcwhpe3.pdf; ComponentLink3Description: http://www.vishay.com/docs/20043/crcwhpe3.pdf; ComponentLink4URL: http://www.farnell.com/datasheets/2045673.pdf; ComponentLink4Description: http://www.farnell.com/datasheets/2045673.pdf; Supplier 3: Digi-Key; Supplier Part Number 3: P10KJDKR-ND; Stock 3: 17450140; Pricing 3: 1=0.1, 10=0.031, 100=0.0125, 1000=0.0056, 2500=0.00486, 5000=0.00401 (USD); Features: Automotive AEC-Q200; ComponentLink5URL: http://industrial.panasonic.com/www-data/pdf/AOA0000/AOA0000CE1.pdf; ComponentLink5Description: http://industrial.panasonic.com/www-data/pdf/AOA0000/AOA0000CE1.pdf; ComponentLink6URL: http://www.farnell.com/datasheets/1678796.pdf; ComponentLink6Description: http://www.farnell.com/datasheets/1678796.pdf; ComponentLink7URL: http://www.mouser.com/ds/2/315/AOA0000CE1-37422.pdf; ComponentLink7Description: http://www.mouser.com/ds/2/315/AOA0000CE1-37422.pdf; ComponentLink8URL: http://www.farnell.com/datasheets/2059623.pdf; ComponentLink8Description: http://www.farnell.com/datasheets/2059623.pdf; ComponentLink9URL: https://www.alliedelec.com/m/d/51cd0790071e1666bdb9d00c57fcf960.pdf; ComponentLink9Description: https://www.alliedelec.com/m/d/51cd0790071e1666bdb9d00c57fcf960.pdf; ComponentLink10URL: http://www.jameco.com/Jameco/Products/ProdDS/1935721.pdf; ComponentLink10Description: http://www.jameco.com/Jameco/Products/ProdDS/1935721.pdf; .SCHCHK: USED
footprint R-0402
pins: 1, 2

## R-10K-0603
designator R?, comment 10K  Case Code (Imperial): 0603
RES SMD 10K OHM 1% 1/10W 0603; Manufacturer: Yageo; Manufacturer Part Number: RC0603FR-0710KL; Resistance: 10kR; Temperature Coefficient: 100ppm/°C; Voltage Rating (DC): 50V; Power Rating: 100mW; Voltage Rating: 75V; .PCBCHK: USED; .Creator: F:TALI; Washability: OK; Supplier 1: Digi-Key; Supplier Part Number 1: 311-10.0KHRCT-ND; Stock 1: 37479107; Pricing 1: 1=0.1, 10=0.026, 100=0.0107, 1000=0.00478, 2500=0.00415 (USD); Case/Package: 0603; Number of Pins: 2; Weight: 7.1E-05oz; Case Code (Metric): 1608; Min Operating Temperature: -55°C; Max Operating Temperature: 155°C; Tolerance: 1%; Composition: Thick Film; Packaging: Tape and Reel; Military Standard: Not; Termination: SMD/SMT; Length: 1.6mm; Height: 0.45mm; Width: 0.8mm; Depth: 0.8mm; Lead Pitch: 0.3mm; REACH SVHC: No SVHC; Lead Free: Lead Free; ComponentLink1URL: http://www.farnell.com/datasheets/38590.pdf; ComponentLink1Description: http://www.farnell.com/datasheets/38590.pdf; ComponentLink2URL: https://www.verical.com/server-webapp/html/getDatasheet?partID=409289; ComponentLink2Description: https://www.verical.com/server-webapp/html/getDatasheet?partID=409289; ComponentLink3URL: http://www.farnell.com/datasheets/1868787.pdf; ComponentLink3Description: http://www.farnell.com/datasheets/1868787.pdf; ComponentLink4URL: http://www.farnell.com/datasheets/443971.pdf; ComponentLink4Description: http://www.farnell.com/datasheets/443971.pdf; ComponentLink5URL: http://www.farnell.com/datasheets/1738695.pdf; ComponentLink5Description: http://www.farnell.com/datasheets/1738695.pdf; Supplier 2: Digi-Key; Supplier Part Number 2: 311-10KGRDKR-ND; Stock 2: 34952003; Pricing 2: 1=0.1, 10=0.022, 100=0.0088, 1000=0.00396, 2500=0.00344 (USD); Contact Plating: Matte,Tin; Radiation Hardening: No; ComponentLink6URL: http://www.yageo.com/documents/recent/PYu-RC_Group_51_RoHS_L_9.pdf; ComponentLink6Description: http://www.yageo.com/documents/recent/PYu-RC_Group_51_RoHS_L_9.pdf; ComponentLink7URL: https://www.verical.com/server-webapp/html/getDatasheet?partID=327958; ComponentLink7Description: https://www.verical.com/server-webapp/html/getDatasheet?partID=327958; ComponentLink8URL: http://www.yageo.com/documents/recent/PYu-RC_Group_51_RoHS_L_2.pdf; ComponentLink8Description: http://www.yageo.com/documents/recent/PYu-RC_Group_51_RoHS_L_2.pdf; Mount: Surface Mount; Package Quantity: 1; Number of Terminations: 2; Max Power Dissipation: 100mW; Working Voltage: 75V; Features: Automotive AEC-Q200; ComponentLink9URL: http://www.farnell.com/datasheets/1678796.pdf; ComponentLink9Description: http://www.farnell.com/datasheets/1678796.pdf; ComponentLink10URL: http://industrial.panasonic.com/www-cgi/jvcr13pz.cgi?E+PZ+3+AOA0002+ERJ1GNJ120C+7+WW; ComponentLink10Description: http://industrial.panasonic.com/www-cgi/jvcr13pz.cgi?E+PZ+3+AOA0002+ERJ1GNJ120C+7+WW; ComponentLink11URL: http://industrial.panasonic.com/www-data/pdf/AOA0000/AOA0000CE1.pdf; ComponentLink11Description: http://industrial.panasonic.com/www-data/pdf/AOA0000/AOA0000CE1.pdf; ComponentLink12URL: http://www.jameco.com/Jameco/Products/ProdDS/2007265.pdf; ComponentLink12Description: http://www.jameco.com/Jameco/Products/ProdDS/2007265.pdf; ComponentLink13URL: https://industrial.panasonic.com/cdbs/www-data/pdf/RDA0000/AOA0000C301.pdf; ComponentLink13Description: https://industrial.panasonic.com/cdbs/www-data/pdf/RDA0000/AOA0000C301.pdf; Supplier 3: Digi-Key; Supplier Part Number 3: YAG1290DKR-ND; Stock 3: 0; Pricing 3: 1=0.1, 10=0.044, 100=0.0178, 1000=0.00798, 2500=0.00693 (USD); .SCHCHK: USED
footprint R-0603
pins: 1, 2

## R-10K-0603-0.1%
designator R?, comment 10K  Tolerance: 0.1%  Case/Package: 0603
RES SMD 10K OHM 0.1% 1/5W 0603; Manufacturer: Panasonic; Manufacturer Part Number: ERJ-PB3B1002V; Resistance: 10kR; Max Power Dissipation: 200mW; Temperature Coefficient: 50ppm/°C; Supplier 1: Digi-Key; Supplier Part Number 1: P20086CT-ND; Stock: 56078; Pricing: 1=0.23, 10=0.191, 25=0.1392, 50=0.101, 100=0.0748, 250=0.0574, 500=0.0452, 1000=0.0313 (USD); RoHS: Yes; Case Code (Metric): 1608; Case Code (Imperial): 0603; Min Operating Temperature: -55°C; Max Operating Temperature: 155°C; Features: Automotive AEC-Q200; Packaging: Tape and Reel; Resistor Type: Thick Film; Number of Terminations: 2; Length: 0.063inch; Width: 0.032inch; Height - Seated (Max): 0.022inch; ComponentLink1URL: https://industrial.panasonic.com/cdbs/www-data/pdf/RDM0000/DMM0000COL5.pdf?src-supplier=Digi-Key; ComponentLink1Description: https://industrial.panasonic.com/cdbs/www-data/pdf/RDM0000/DMM0000COL5.pdf?src-supplier=Digi-Key; ComponentLink2URL: https://industrial.panasonic.com/sa/system/files/data/download/catalog/id_fixed-resistors_e_2.pdf?src-supplier=Digi-Key; ComponentLink2Description: https://industrial.panasonic.com/sa/system/files/data/download/catalog/id_fixed-resistors_e_2.pdf?src-supplier=Digi-Key
footprint R-0603
pins: 1, 2

## R-10K-0805
designator R?, comment 10K  Case Code (Imperial): 0805
RES SMD 10K OHM 1/8W 1% 0805; Manufacturer: Stackpole Electronics; Manufacturer Part Number: RMCF0805FT10K0; .PCBCHK: USED; .Creator: F:TALI; Washability: OK; Resistance: 10kR; Power Rating: 125mW; Temperature Coefficient: 100ppm/°C; ComponentLink1URL: http://www.farnell.com/datasheets/444164.pdf; ComponentLink1Description: http://www.farnell.com/datasheets/444164.pdf; ComponentLink2URL: http://www.yageo.com/documents/recent/PYu-RC_Group_51_RoHS_L_9.pdf; ComponentLink2Description: http://www.yageo.com/documents/recent/PYu-RC_Group_51_RoHS_L_9.pdf; ComponentLink3URL: http://www.yageo.ru/pdf/RC0805.pdf; ComponentLink3Description: http://www.yageo.ru/pdf/RC0805.pdf; ComponentLink4URL: http://www.mouser.com/ds/2/427/dcrcwe3-109170.pdf; ComponentLink4Description: http://www.mouser.com/ds/2/427/dcrcwe3-109170.pdf; ComponentLink5URL: http://uk.rs-online.com/webdocs/0d98/0900766b80d98b26.pdf; ComponentLink5Description: http://uk.rs-online.com/webdocs/0d98/0900766b80d98b26.pdf; ComponentLink6URL: http://www.alliedelec.com/m/d/0c934d6939ccefa68dbe0b96d821c8cf.pdf; ComponentLink6Description: http://www.alliedelec.com/m/d/0c934d6939ccefa68dbe0b96d821c8cf.pdf; ComponentLink7URL: http://www.vishay.com/docs/20035/dcrcwe3.pdf; ComponentLink7Description: http://www.vishay.com/docs/20035/dcrcwe3.pdf; ComponentLink8URL: http://www.farnell.com/datasheets/1720486.pdf; ComponentLink8Description: http://www.farnell.com/datasheets/1720486.pdf; .SCHCHK: USED; Supplier 1: Digi-Key; Supplier Part Number 1: RMCF0805FT10K0CT-ND; Stock: 3672884; Pricing: 1=0.1, 10=0.023, 100=0.0094, 1000=0.0042, 2500=0.0037 (USD); RoHS: Yes; Mount: Surface Mount; Case/Package: 0805; Case Code (Metric): 2012; Contact Plating: Tin,Matte; Min Operating Temperature: -55°C; Max Operating Temperature: 155°C; Tolerance: 1%; Packaging: Tape and Reel; Resistor Type: Thick Film; Number of Terminations: 2; Features: Automotive AEC-Q200; Max Power Dissipation: 125mW; Length: 2mm; Height: 0.026inch; Depth: 1.25mm; Width: 0.049inch; Radiation Hardening: No; Lead Free: Lead Free; Military Standard: Not; ComponentLink9URL: https://datasheet.ciiva.com/15193/getdatasheetpartid-362046-15193525.pdf?src-supplier=Verical; ComponentLink9Description: https://datasheet.ciiva.com/15193/getdatasheetpartid-362046-15193525.pdf?src-supplier=Verical
footprint R-0805
pins: 1, 2

## R-10K-1206
designator R?, comment 10K  Case Code (Imperial): 1206
RES SMD 10K OHM 1% 1/3W 1206; Manufacturer: Stackpole Electronics; Manufacturer Part Number: RNCP1206FTD10K0; .PCBCHK: USED; .Creator: F:TALI; Washability: OK; Max Power Dissipation: 500mW; Temperature Coefficient: 100ppm/°C; Resistance: 10kR; ComponentLink1URL: http://www.rohm.com/web/global/datasheet/ESR01MZPF/esr-e; ComponentLink1Description: http://www.rohm.com/web/global/datasheet/ESR01MZPF/esr-e; ComponentLink2URL: https://www.rohm.com/datasheet/ESR01MZPF/esr-e; ComponentLink2Description: https://www.rohm.com/datasheet/ESR01MZPF/esr-e; .SCHCHK: USED; Supplier 1: Digi-Key; Supplier Part Number 1: RNCP1206FTD10K0CT-ND; Stock: 171000; Pricing: 1=0.1, 10=0.081, 100=0.031, 1000=0.0136, 2500=0.0118 (USD); RoHS: Yes; Mount: Surface Mount; Case/Package: 1206; Case Code (Metric): 3216; Min Operating Temperature: -55°C; Max Operating Temperature: 155°C; Tolerance: 1%; Packaging: Tape and Reel; Resistor Type: Thin Film; Number of Terminations: 2; Features: Moisture Resistant,Anti-Sulfur; Length: 0.122inch; Height: 0.024inch; Width: 0.059inch; ComponentLink3URL: https://www.seielect.com/catalog/SEI-Packaging.pdf?src-supplier=Digi-Key; ComponentLink3Description: https://www.seielect.com/catalog/SEI-Packaging.pdf?src-supplier=Digi-Key
footprint R-1206
pins: 1, 2

## R-10M-0603
designator R?, comment 10M  Case Code (Imperial): 0603